# Altium footprint library IC.PcbLib: 386 footprints (part 15 of 30)
Each footprint in its own frame and in the unit in brackets; x right, y up, seen from the top. Pads: shape width x height; smd on the part's side, far side on the other; paste and mask are expansions set on the pad; w line width, h text height; cw(c..) or ccw(c..) is an arc to the next point about the centre after c.
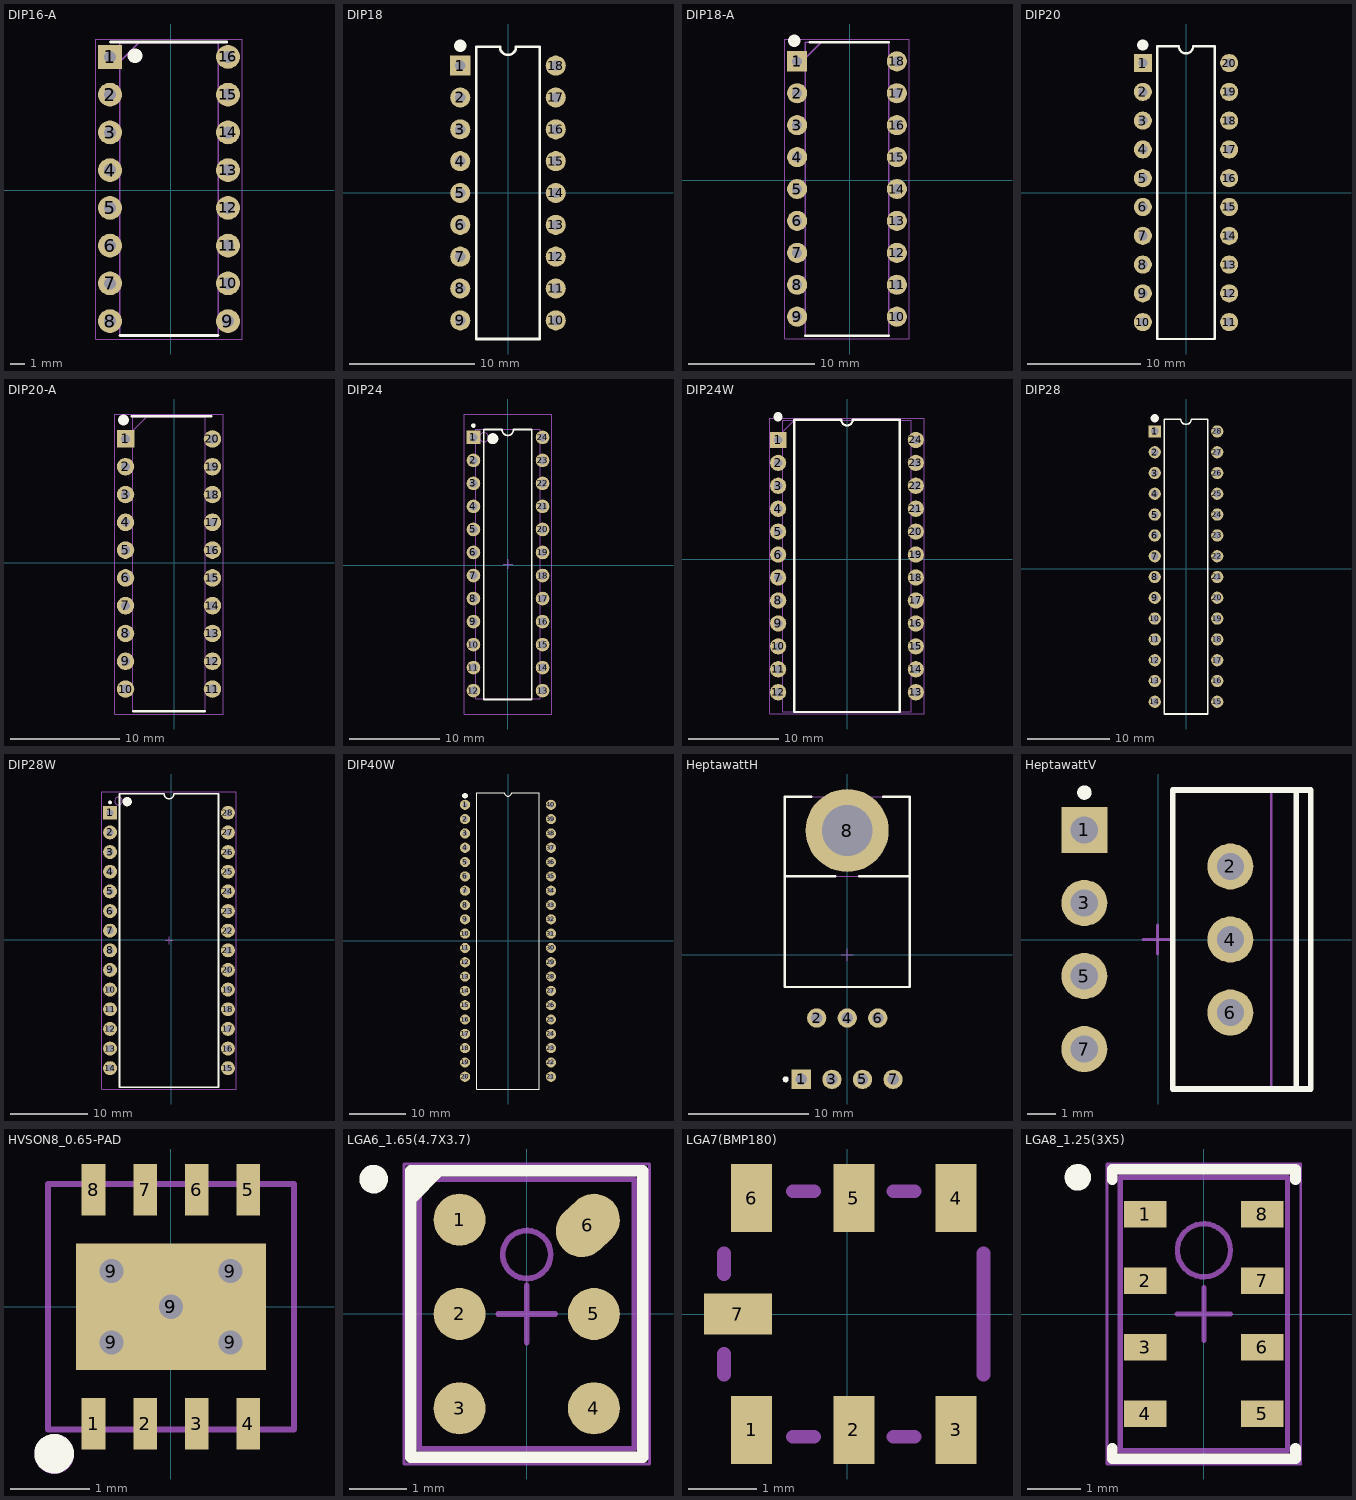
[diagram p14: the footprints below, top view; thin cyan lines are the x and y axes]

## DIP16-A [mm]
pads (16):
  rect 1.6x1.6 hole 0.8: 1(-4.097,8.966)
  round 1.6 hole 0.8: 2(-4.097,6.426) 3(-4.097,3.886) 4(-4.097,1.346) 5(-4.097,-1.194) 6(-4.097,-3.734) 7(-4.097,-6.274) 8(-4.097,-8.814) 9(3.843,-8.814) 10(3.843,-6.274) 11(3.843,-3.734) 12(3.843,-1.194) 13(3.843,1.346) 14(3.843,3.886) 15(3.843,6.426) 16(3.843,8.966)
Top Overlay:
  lines w0.2: -4.076,9.982 3.759,9.982 ; -3.427,-9.769 3.173,-9.769
  lines w1: -2.414,9.043 -2.413,9.042
Mechanical 13:
  lines w0.1: -3.427,8.651 -2.157,9.921 ; -3.427,-9.769 -3.427,9.921 3.173,9.921 3.173,-9.769 -3.427,-9.769
Mechanical 15:
  lines w0.05: -5.072,-10.019 -5.072,10.171 4.818,10.171 4.818,-10.019 -5.072,-10.019
3D body "CD4052BEE4.stp": height 5.08, standoff -3.5, extent -4.229,-9.576 3.975,9.729

## DIP18 [mm]
pads (18):
  rect 1.6x1.6 hole 0.8: 1(-3.81,10.16)
  round 1.6 hole 0.8: 2(-3.81,7.62) 3(-3.81,5.08) 4(-3.81,2.54) 5(-3.81,0) 6(-3.81,-2.54) 7(-3.81,-5.08) 8(-3.81,-7.62) 9(-3.81,-10.16) 10(3.81,-10.16) 11(3.81,-7.62) 12(3.81,-5.08) 13(3.81,-2.54) 14(3.81,0) 15(3.81,2.54) 16(3.81,5.08) 17(3.81,7.62) 18(3.81,10.16)
Top Overlay:
  lines w0.2: 2.54,-11.65 2.54,11.65 0.635,11.65 cw(c0,11.65) -0.635,11.65 -2.54,11.65 -2.54,-11.65 2.54,-11.65 ; 2.54,-11.65 2.54,-11.65
  lines w1: -3.811,11.761 -3.81,11.76
3D body "DIP18.STEP": height 5.08, standoff -2.49, extent -3.935,-11.495 3.935,11.495

## DIP18-A [mm]
pads (18):
  rect 1.6x1.6 hole 0.8: 1(-4.198,9.449)
  round 1.6 hole 0.8: 2(-4.198,6.909) 3(-4.198,4.369) 4(-4.198,1.829) 5(-4.198,-0.711) 6(-4.198,-3.251) 7(-4.198,-5.791) 8(-4.198,-8.331) 9(-4.198,-10.871) 10(3.74,-10.871) 11(3.74,-8.331) 12(3.74,-5.791) 13(3.74,-3.251) 14(3.74,-0.711) 15(3.74,1.829) 16(3.74,4.369) 17(3.74,6.909) 18(3.74,9.449)
Top Overlay:
  lines w0.2: -3.531,-12.395 3.073,-12.395 ; -3.175,10.973 3.073,10.973
  lines w1: -4.42,11.075 -4.419,11.074
Mechanical 13:
  lines w0.1: -3.531,9.703 -2.261,10.973 ; -3.531,-12.395 3.073,-12.395 3.073,10.973 -3.531,10.973 -3.531,-12.395
Mechanical 15:
  lines w0.05: -5.186,-12.645 4.728,-12.645 4.728,11.223 -5.186,11.223 -5.186,-12.645
3D body "LM3914N-1_NOPB.stp": height 5.33, standoff -3.5, extent -4.337,-12.141 3.88,10.719

## DIP20 [mm]
pads (20):
  rect 1.6x1.6 hole 0.8: 1(-3.81,11.43)
  round 1.6 hole 0.8: 2(-3.81,8.89) 3(-3.81,6.35) 4(-3.81,3.81) 5(-3.81,1.27) 6(-3.81,-1.27) 7(-3.81,-3.81) 8(-3.81,-6.35) 9(-3.81,-8.89) 10(-3.81,-11.43) 11(3.81,-11.43) 12(3.81,-8.89) 13(3.81,-6.35) 14(3.81,-3.81) 15(3.81,-1.27) 16(3.81,1.27) 17(3.81,3.81) 18(3.81,6.35) 19(3.81,8.89) 20(3.81,11.43)
Top Overlay:
  lines w0.2: 2.54,-12.92 2.54,-12.92 ; 2.54,-12.92 -2.54,-12.92 -2.54,12.92 -0.635,12.92 ccw(c0,12.92) 0.635,12.92 2.54,12.92 2.54,-12.92
  lines w1: -3.811,13.031 -3.81,13.03
3D body "DIP20.STEP": height 4.5, standoff -3.5, extent -3.88,-12.8 3.88,12.8

## DIP20-A [mm]
pads (20):
  rect 1.6x1.6 hole 0.8: 1(-4.427,11.328)
  round 1.6 hole 0.8: 2(-4.427,8.788) 3(-4.427,6.248) 4(-4.427,3.708) 5(-4.427,1.168) 6(-4.427,-1.372) 7(-4.427,-3.912) 8(-4.427,-6.452) 9(-4.427,-8.992) 10(-4.427,-11.532) 11(3.513,-11.532) 12(3.513,-8.992) 13(3.513,-6.452) 14(3.513,-3.912) 15(3.513,-1.372) 16(3.513,1.168) 17(3.513,3.708) 18(3.513,6.248) 19(3.513,8.788) 20(3.513,11.328)
Top Overlay:
  lines w0.2: -3.886,13.411 3.441,13.411 ; -3.757,-13.562 2.843,-13.562
  lines w1: -4.597,13.056 -4.597,13.055
Mechanical 13:
  lines w0.1: -3.757,12.088 -2.487,13.358 ; -3.757,-13.562 -3.757,13.358 2.843,13.358 2.843,-13.562 -3.757,-13.562
Mechanical 15:
  lines w0.05: -5.402,-13.812 -5.402,13.608 4.488,13.608 4.488,-13.812 -5.402,-13.812
3D body "SN74HC245N.stp": height 5.08, standoff -3.5, extent -4.56,-12.802 3.645,12.598

## DIP24 [mm]
pads (24):
  rect 1.5x1.5 hole 0.9: 1(-3.759,14.122)
  round 1.5 hole 0.9: 2(-3.759,11.582) 3(-3.759,9.042) 4(-3.759,6.502) 5(-3.759,3.962) 6(-3.759,1.422) 7(-3.759,-1.118) 8(-3.759,-3.658) 9(-3.759,-6.198) 10(-3.759,-8.738) 11(-3.759,-11.278) 12(-3.759,-13.818) 13(3.861,-13.818) 14(3.861,-11.278) 15(3.861,-8.738) 16(3.861,-6.198) 17(3.861,-3.658) 18(3.861,-1.118) 19(3.861,1.422) 20(3.861,3.962) 21(3.861,6.502) 22(3.861,9.042) 23(3.861,11.582) 24(3.861,14.122)
Top Overlay:
  circle w0.6: c-1.625,13.979 r0.3
  circle w0.25: c-3.759,15.422 r0.125
  lines w0.2: -2.625,-14.783 2.675,-14.783 2.675,14.979 0.66,14.979 cw(c0.025,14.979) -0.61,14.979 -2.625,14.979 -2.625,-14.783
Mechanical 13:
  circle w0.1: c-2.599,14.131 r0.5
  lines w0.1: -3.499,-14.707 3.601,-14.707 3.601,15.031 -3.499,15.031 -3.499,-14.707
Mechanical 15:
  lines w0.05: -4.799,-16.398 4.901,-16.398 4.901,16.702 -4.799,16.702 -4.799,-16.398
  lines w0.1: -0.449,0.152 0.551,0.152 ; 0.051,-0.348 0.051,0.652
3D body "User Library-DIP-24P-M03.step": height 4.36, standoff -3, extent -3.833,-14.707 4.037,14.993

## DIP24W [mm]
pads (24):
  rect 1.8x1.8 hole 0.9: 1(-7.671,13.233)
  round 1.8 hole 0.9: 2(-7.671,10.693) 3(-7.671,8.153) 4(-7.671,5.613) 5(-7.671,3.073) 6(-7.671,0.533) 7(-7.671,-2.007) 8(-7.671,-4.547) 9(-7.671,-7.087) 10(-7.671,-9.627) 11(-7.671,-12.167) 12(-7.671,-14.707) 13(7.569,-14.707) 14(7.569,-12.167) 15(7.569,-9.627) 16(7.569,-7.087) 17(7.569,-4.547) 18(7.569,-2.007) 19(7.569,0.533) 20(7.569,3.073) 21(7.569,5.613) 22(7.569,8.153) 23(7.569,10.693) 24(7.569,13.233)
Top Overlay:
  lines w0.254: -5.88,-16.891 5.779,-16.891 5.779,15.469 0.584,15.469 cw(c-0.051,15.469) -0.686,15.469 -5.88,15.469 -5.88,-16.891
  lines w1: -7.672,15.799 -7.671,15.799
Mechanical 13:
  lines w0.1: -7.161,14.123 -5.891,15.393 ; -7.161,-16.867 7.059,-16.867 7.059,15.393 -7.161,15.393 -7.161,-16.867
Mechanical 15:
  lines w0.05: -8.611,-17.117 8.509,-17.117 8.509,15.643 -8.611,15.643 -8.611,-17.117
3D body "CD74HC4067E.stp": height 5.08, standoff -3.5, extent -7.803,-16.612 7.702,15.138

## DIP28 [mm]
pads (28):
  rect 1.5x1.5 hole 0.9: 1(-3.81,16.764)
  round 1.5 hole 0.9: 2(-3.81,14.224) 3(-3.81,11.684) 4(-3.81,9.144) 5(-3.81,6.604) 6(-3.81,4.064) 7(-3.81,1.524) 8(-3.81,-1.016) 9(-3.81,-3.556) 10(-3.81,-6.096) 11(-3.81,-8.636) 12(-3.81,-11.176) 13(-3.81,-13.716) 14(-3.81,-16.256) 15(3.81,-16.256) 16(3.81,-13.716) 17(3.81,-11.176) 18(3.81,-8.636) 19(3.81,-6.096) 20(3.81,-3.556) 21(3.81,-1.016) 22(3.81,1.524) 23(3.81,4.064) 24(3.81,6.604) 25(3.81,9.144) 26(3.81,11.684) 27(3.81,14.224) 28(3.81,16.764)
Top Overlay:
  lines w0.2: -2.65,-17.746 -2.65,18.254 -0.635,18.254 ccw(c0,18.254) 0.635,18.254 2.65,18.254 2.65,-17.746 -2.65,-17.746
  lines w1: -3.811,18.365 -3.81,18.364
3D body "DIP28.STEP": height 5.08, standoff -2.49, extent -3.884,-17.797 3.986,18.203

## DIP28W [mm]
pads (28):
  rect 1.8x1.8 hole 0.9: 1(-7.899,16.434)
  round 1.8 hole 0.9: 2(-7.899,13.894) 3(-7.899,11.354) 4(-7.899,8.814) 5(-7.899,6.274) 6(-7.899,3.734) 7(-7.899,1.194) 8(-7.899,-1.346) 9(-7.899,-3.886) 10(-7.899,-6.426) 11(-7.899,-8.966) 12(-7.899,-11.506) 13(-7.899,-14.046) 14(-7.899,-16.586) 15(7.341,-16.586) 16(7.341,-14.046) 17(7.341,-11.506) 18(7.341,-8.966) 19(7.341,-6.426) 20(7.341,-3.886) 21(7.341,-1.346) 22(7.341,1.194) 23(7.341,3.734) 24(7.341,6.274) 25(7.341,8.814) 26(7.341,11.354) 27(7.341,13.894) 28(7.341,16.434)
Top Overlay:
  circle w0.6: c-5.679,17.874 r0.3
  circle w0.25: c-7.899,17.784 r0.125
  lines w0.2: -6.679,-19.026 6.121,-19.026 6.121,18.874 0.356,18.874 cw(c-0.279,18.874) -0.914,18.874 -6.679,18.874 -6.679,-19.026
Mechanical 13:
  circle w0.1: c-6.804,17.949 r0.5
Mechanical 15:
  lines w0.05: -8.979,-19.276 8.421,-19.276 8.421,19.124 -8.979,19.124 -8.979,-19.276
  lines w0.1: -0.779,-0.076 0.221,-0.076 ; -0.279,-0.576 -0.279,0.424
3D body "User Library-DIP28-600.step": height 5.7, standoff -2.58, extent -7.948,-18.752 7.542,18.548

## DIP40W [mm]
pads (40):
  round 1.8 hole 0.9: 1(-7.62,24.13) 2(-7.62,21.59) 3(-7.62,19.05) 4(-7.62,16.51) 5(-7.62,13.97) 6(-7.62,11.43) 7(-7.62,8.89) 8(-7.62,6.35) 9(-7.62,3.81) 10(-7.62,1.27) 11(-7.62,-1.27) 12(-7.62,-3.81) 13(-7.62,-6.35) 14(-7.62,-8.89) 15(-7.62,-11.43) 16(-7.62,-13.97) 17(-7.62,-16.51) 18(-7.62,-19.05) 19(-7.62,-21.59) 20(-7.62,-24.13) 21(7.62,-24.13) 22(7.62,-21.59) 23(7.62,-19.05) 24(7.62,-16.51) 25(7.62,-13.97) 26(7.62,-11.43) 27(7.62,-8.89) 28(7.62,-6.35) 29(7.62,-3.81) 30(7.62,-1.27) 31(7.62,1.27) 32(7.62,3.81) 33(7.62,6.35) 34(7.62,8.89) 35(7.62,11.43) 36(7.62,13.97) 37(7.62,16.51) 38(7.62,19.05) 39(7.62,21.59) 40(7.62,24.13)
Top Overlay:
  lines w0.2: -5.535,-26.3 -5.535,26.3 -0.635,26.3 ccw(c0,26.3) 0.635,26.3 5.535,26.3 5.535,-26.3 ; -5.533,-26.3 5.537,-26.3
  lines w1: -7.621,25.731 -7.62,25.73
3D body "PDIP40.STEP": height 5.49, standoff -2.68, extent -7.75,-26.3 7.75,26.3

## HeptawattH [mm]
pads (8):
  rect 1.6x1.6 hole 0.95: 1(-3.81,-10.34)
  round 1.6 hole 0.95: 2(-2.54,-5.24) 3(-1.27,-10.34) 4(0,-5.24) 5(1.27,-10.34) 6(2.54,-5.24) 7(3.81,-10.34)
  round 6.9 hole 4.2: 8(0,10.34)
Top Overlay:
  circle w0.25: c-5.11,-10.34 r0.125
  lines w0.2: -5.2,6.54 -1,6.54 ; -3,13.14 -5.2,13.14 -5.2,-2.66 5.2,-2.66 5.2,13.14 3,13.14 ; 1,6.54 5.2,6.54
Mechanical 13:
  circle w0.1: c0.003,10.314 r1.925
  lines w0.1: -5.2,6.54 5.2,6.54 ; -5.2,-2.66 -5.2,13.14 5.2,13.14 5.2,-2.66 -5.2,-2.66
Mechanical 15:
  lines w0.1: -0.5,0 0.5,0 ; 0,-0.5 0,0.5
3D body: height 1.37, standoff 0, extent -5.199,6.541 5.199,13.139
3D body: height 1.37, standoff 0, extent -1.921,8.39 1.927,12.238
3D body: height 4.8, standoff 0, extent -5.199,-2.659 5.199,6.539

## HeptawattV [mm]
pads (7):
  rect 1.6x1.6 hole 0.95: 1(-2.565,3.81)
  round 1.6 hole 0.95: 2(2.515,2.54) 3(-2.565,1.27) 4(2.515,0) 5(-2.565,-1.27) 6(2.515,-2.54) 7(-2.565,-3.81)
Top Overlay:
  circle w0.25: c-2.565,5.11 r0.125
  lines w0.2: 4.805,-5.2 4.805,5.2 ; 0.505,-5.2 5.305,-5.2 5.305,5.2 0.505,5.2 0.505,-5.2
Mechanical 13:
  lines w0.1: 3.935,-5.2 3.935,5.2 ; 0.505,-5.2 5.305,-5.2 5.305,5.2 0.505,5.2 0.505,-5.2
Mechanical 15:
  lines w0.1: -0.525,0 0.475,0 ; -0.025,-0.5 -0.025,0.5
3D body "User Library-HeptawattV.step": height 19.5, standoff -1.7, extent -2.694,-4.973 5.486,5.227

## HVSON8_0.65-PAD [mm]
pads (14):
  rect 0.3x0.65 smd: 1(-0.975,-1.475) 2(-0.325,-1.475) 3(0.325,-1.475) 4(0.975,-1.475) 5(0.975,1.475) 6(0.325,1.475) 7(-0.325,1.475) 8(-0.975,1.475)
  round 0.61 hole 0.305: 9(-0.75,-0.45) 9(-0.75,0.45) 9(0,0) 9(0.75,-0.45) 9(0.75,0.45)
  rect 2.4x1.6 smd paste-3: 9(0,0)
Top Overlay:
  circle w0.25: c-1.473,-1.854 r0.125
Top Paste:
  region: -0.125,0.125 -0.125,0.775 -1.125,0.775 -1.125,0.125
  region: -1.125,-0.125 -1.125,-0.775 -0.125,-0.775 -0.125,-0.125
  region: 0.125,-0.125 0.125,-0.775 1.125,-0.775 1.125,-0.125
  region: 1.125,0.125 1.125,0.775 0.125,0.775 0.125,0.125
Mechanical 15:
  circle w0.25: c-1.471,-1.859 r0.125
  lines w0.076: -1.55,-1.55 -1.55,1.55 1.55,1.55 1.55,-1.55 -1.55,-1.55
3D body "HVSON-8.STEP": height 1, standoff 0, extent -1.49,-1.5 1.49,1.5

## LGA6_1.65(4.7X3.7) [mm] "LGA, 6-Leads, Body 4.72x3.76mm, Pitch 1.65mm"
height 1.38
pads (6):
  round 0.91 smd: 1(-1.175,1.65) 2(-1.175,0) 3(-1.175,-1.65) 4(1.175,-1.65) 5(1.175,0)
  oval 0.91x1.2 smd rot 133.5: 6(1.07,1.55)
Top Overlay:
  circle w0.25: c-2.68,2.36 r0.125
  region: -1.524,2.51 -2.03,2.004 -2.03,2.51
  lines w0.2: -2.03,2.004 -1.524,2.51 ; -2.03,-2.51 2.03,-2.51 2.03,2.51 -2.03,2.51 -2.03,-2.51
Mechanical 13:
  circle w0.1: c0,1.04 r0.42
  lines w0.1: -1.88,-2.36 1.88,-2.36 1.88,2.36 -1.88,2.36 -1.88,-2.36
Mechanical 15:
  lines w0.05: -2.15,-2.625 2.15,-2.625 2.15,2.625 -2.15,2.625 -2.15,-2.625
  lines w0.1: -0.5,0 0.5,0 ; 0,-0.5 0,0.5
3D body: height 1.4, standoff 0, extent -1.613,1.257 -0.774,2.096
3D body: height 1.38, standoff 0, extent -1.88,-2.36 1.88,2.36

## LGA7(BMP180) [mm]
pads (7):
  rect 0.6x1 smd: 1(-1.4,-1.7) 2(0.1,-1.7) 3(1.6,-1.7) 4(1.6,1.7) 5(0.1,1.7) 6(-1.4,1.7)
  rect 1x0.6 smd: 7(-1.6,0)
Mechanical 15:
  lines w0.203: -1.806,-0.891 -1.806,-0.586 ; -1.806,0.582 -1.806,0.887 ; -0.79,-1.8 -0.486,-1.8 ; -0.79,1.8 -0.486,1.8 ; 0.683,-1.8 0.988,-1.8 ; 0.683,1.8 0.988,1.8 ; 2,-0.891 2,0.887
3D body: height 0.8, standoff 0, extent -1.803,-1.829 1.981,1.854
3D body: height 0.85, standoff 0.1, extent -1.621,-1.571 -1.222,-1.172

## LGA8_1.25(3X5) [mm] "SON, 8-Leads, Body 3x5mm, Pitch 1.25mm"
height 1.1
pads (8):
  rect 0.8x0.5 smd paste-0.25 mask+0.051: 1(-1.102,1.875) 2(-1.102,0.625) 3(-1.102,-0.625) 4(-1.102,-1.875) 5(1.102,-1.875) 6(1.102,-0.625) 7(1.102,0.625) 8(1.102,1.875)
Top Overlay:
  circle w0.25: c-2.375,2.575 r0.125
  lines w0.2: -1.725,-2.525 -1.725,-2.725 1.725,-2.725 1.725,-2.525 ; -1.725,2.525 -1.725,2.725 1.725,2.725 1.725,2.525
Top Paste:
  rectangle: -1.5,1.625 -0.7,2.125
  region: 1.5,2.125 0.7,2.125 0.7,1.625 1.5,1.625
  rectangle: -1.5,0.375 -0.7,0.875
  rectangle: -1.5,-0.875 -0.7,-0.375
  rectangle: -1.5,-2.125 -0.7,-1.625
  region: 1.5,-1.625 0.7,-1.625 0.7,-2.125 1.5,-2.125
  region: 1.5,-0.375 0.7,-0.375 0.7,-0.875 1.5,-0.875
  region: 1.5,0.875 0.7,0.875 0.7,0.375 1.5,0.375
Mechanical 13:
  circle w0.1: c0,1.2 r0.5
  lines w0.1: -1.575,-2.575 1.575,-2.575 1.575,2.575 -1.575,2.575 -1.575,-2.575
Mechanical 15:
  lines w0.05: -1.825,-2.825 1.825,-2.825 1.825,2.825 -1.825,2.825 -1.825,-2.825
  lines w0.1: -0.5,0 0.5,0 ; 0,-0.5 0,0.5
3D body: height 1.1, standoff 0, extent -1.6,-2.6 1.55,2.55
3D body: height 1.15, standoff 0.1, extent -1.415,1.834 -0.818,2.433